# Altium schematic symbol library CUSTOM SCH - Copy.SchLib: 494 symbols (part 4 of 6) (continued)
## RTL8211F (continued)

## S2B-PH-SM4-TB(LF)(SN)
designator J?
Connector Header Surface Mount, Right Angle 2 position 0.079 _2.00mm_; Manufacturer Part Number: S2B-PH-SM4-TB_LF__SN_
footprint JST_S2B-PH-SM4-TB(LF)(SN)
footprint S2B-PH-SM4-TB(LF)(SN) (Header connector)
pins: 1, 2, S1 SHIELD, S2 SHIELD

## S25FL256SAGMFI000
designator U?
NOR Flash 256Mb 3V 133MHz Serial NOR Flash; Manufacturer Part Number: S25FL256SAGMFI000
part B pins: 1 HOLD#/IO3, 2 VCC, 3 RESET#/RFU, 4 DNU, 5 DNU, 6 RFU, 7 CS#, 8 SO/IO1, 9 WP#/IO2, 10 VSS, 11 DNU, 12 DNU, 13 NC, 14 VIO/RFU, 15 SI/IO0, 16 SCK

## SAMTEC-TSM-113-01-X-DV
designator J?  Manufacturer Part Number: TSM-113-01-S-DV
CONN HEADER SMD 26POS 2.54MM; Manufacturer: Samtec; Max Current Rating: 7A; Max Voltage Rating (AC): 475V; Number of Contacts: 26; Gender: Male; Connector Type: Male Pin; Row Spacing: 0.1inch
footprint *SAMTEC-TSM-113-01-X-DV
pins: 1, 2, 3, 4, 5, 6, 7, 8, 9, 10, 11, 12, 13, 14, 15, 16, 17, 18, 19, 20, 21, 22, 23, 24, 25, 26, 27, 28

## SAMTEC_QTE-020-01-F-D-A
designator J?
0.8mm Pitch 40 Position Connector Header, Outer Shroud Contacts Surface Mount Gold; Manufacturer Part Number: QTE-020-01-F-D-A; Case/Package: SMD
footprint SAMTEC_QTE-020-01-F-D-A
pins: 01, 02, 03, 04, 05, 06, 07, 08, 09, 10, 11, 12, 13, 14, 15, 16, 17, 18, 19, 20, 21, 22, 23, 24, 25, 26, 27, 28, 29, 30, 31, 32, 33, 34, 35, 36, 37, 38, 39, 40, G1 GND (power), G2 GND (power), G3 GND (power), G4 GND (power)

## SATA 3.0 Connector
designator J?
Manufacturer Part Number: *; Case/Package: *
footprint SATA30_7P_V_DIP
pins: 1 GND1, 2 TXP, 3 TXN, 4 GND2, 5 RXN, 6 RXP, 7 GND3, 8 GND4, 9 GND5

## SATA Connector
designator J?
Connector SATA BACKPLANE RECEPTACLE; Manufacturer Part Number: 1735284-2; Case/Package: SMD, Verticle
footprint SATA Connector (22 Pin SATA Connector)
pins: MP1, MP2, P1, P2, P3, P4, P5, P6, P7, P8, P9, P10, P11, P12, P13, P14, P15, S1, S2, S3, S4, S5, S6, S7

## SATA IDE Connector
designator J?
Manufacturer Part Number: *; Case/Package: TH
pins: 1 +5V, 2 GND1, 3 GND2, 4 +12V

## SATA_HYCW03-SATA22-420B
designator J?  Case/Package: SMD,P=1.27mm  Manufacturer Part Number: HYCW03-SATA22-420B
22 pin SATA, SMD,P=1.27mm Card Edge Connectors; Value: *
footprint HYCW03-SATA22-420B
pins: 1 GND, 2 TX+, 3 TX-, 4 GND, 5 RX-, 6 RX+, 7 GND, 8 3V3 DC, 9 3V3 DC, 10 3V3 DC, 11 GND, 12 GND, 13 GND, 14 5V DC, 15 5V DC, 16 5V DC, 17 GND, 18 GND, 19 GND, 20 12V DC, 21 12V DC, 22 12V DC, 23, 24

## SC530AI
designator U?
Image sensor 1/2.7"; Manufacturer Part Number: SC530AI; Case/Package: CSP 41-pin
footprint CSP41 (SC530AI)
1 alternate drawing of the same symbol

## SCHOTTKY
designator D?
Diode, Schottky, 40V, 5A, SMC; ComponentLink1Description: Datasheet link; ComponentLink1URL: http://www.comchip.com.tw/cms/UserFiles/QW-BB012%20CDBC520-G%7E5100-G%20RevC809622.pdf; Manufacturer Part Number: *; Case/Package: *
pins: A, K

## Schottky Dual Common Cathode_0
designator D?
pins: 1 A1, 2 A2, 3 K

## Screw Terminal
designator J?
5mm Pitch Fixed Terminal Blocks screw type; Manufacturer Part Number: TB001-500-02BE; Case/Package: 5mm Pitch TH
footprint Screw Terminal (5mm Pitch)
pins: 1, 2

## SCT2220TVBR
designator U?  Manufacturer Part Number: SCT2220TVBR
DC-DC Converters 2A, SOT563-6L; Case/Package: SOT563-6L
footprint SOT563
pins: 1 VIN, 2 SW, 3 GND, 4 BST, 5 EN, 6 FB

## SCT2230TVAR
designator U?, comment Manufacturer Part Number: SCT2230TVAR  (hidden comment: C918194)
DC-DC Converters 3A, SOT563-6L; Case/Package: SOT563-6L
footprint SOT563
pins: 1 VIN, 2 SW, 3 GND, 4 BST, 5 EN, 6 FB

## SCT2250FPAR
designator U16
DC-DC Converters 5A ,QFN-12 2x3mm; Case/Package: QFN-12; Manufacturer Part Number: SCT2250FPAR
footprint QFN-12_2x3mm
pins: 1 VIN, 2 PGND, 3 PG, 4 FSEL, 5 VOUT, 6 MODE, 7 SW, 8 BST, 9 VCC, 10 AGND, 11 FB, 12 EN

## SD6271LR-G1
designator U?  (value not drawn)
Step-Up Positive Adjustable 1 2A 1MHz SOT-23-6 DC-DC Converters RoHS; Value: 2A 1Mhz boost; Case/Package: SOT-23-6; Manufacturer Part Number: SD6271LR-G1
footprint SOT-23-6
pins: 1 LX, 2 GND, 3 FB, 4 EN, 5 VCC, 6 OC

## SD Card
designator J?, comment DM3AT-SF-PEJM5(40)
Micro,std mount SD Memory Card Micro,std mount SD Memory Card; Manufacturer Part Number: DM3AT-SF-PEJM5(40); Case/Package: SMD
footprint DM3AT-SF-PEJM5(40)
pins: 1 D2, 2 CS/D3, 3 CMD, 4 VDD_3V3, 5 CLK, 6 GND, 7 D0, 8 D1, 9 CD
text: μSD CARD SOCKET

## SD Card Socket
designator J?
Memory Card Connectors TFR PUSH PUSH TYPE V YPE VSS DEECT SWITCH; Manufacturer Part Number: TF-018B-H15; Case/Package: SMD
footprint 473521001
footprint mix SD card socket
pins: 1 DATA2, 2 CD/DATA3, 3 CMD, 4 VDD, 5 CLK, 6 VSS, 7 DATA0, 8 DATA1, 9 SW, 10 SHIELD

## SDA04H1SBD
designator S?
SWITCH SLIDE DIP SPST 25MA 24V; Manufacturer: ITT C&K; Manufacturer Part Number: SDA04H1SBD; Body Material: Polyphenylene; Mechanical Life: 1000Cycles; Actuator Material: Polyamide; Number of Positions: 4; Max Current Rating: 100mA; Contact Resistance: 50mR; Actuator Type: Slide (Standard); Pitch: 0.1inch; Actuator Length: 1mm; Washable: Yes; Supplier 1: Digi-Key; Stock 1: 11767; Pricing 1: 1=1.66, 10=1.563, 35=1.4994, 70=1.4036, 105=1.3717, 280=1.2122, 525=1.1484, 1015=1.0208, 5005=0.8932 (USD); Mount: Surface Mount; Case/Package: DIP; Contact Material: Copper; Contact Plating: Gold; Min Operating Temperature: -40°C; Max Operating Temperature: 85°C; Throw Configuration: SPST; Packaging: Rail/Tube; Current Rating: 25mA; Package Quantity: 35; Voltage Rating (DC): 24V; Max Voltage Rating (DC): 24V; Termination: Gull Wing; Electrical Life: 1000Cycles; Number of Circuits: 4; Orientation: Straight; Length: 0.476inch; Terminal Pitch: 2.54mm; Depth: 9.3mm; Radiation Hardening: No; REACH SVHC: No SVHC; Lead Free: Lead Free; ComponentLink1URL: https://www.ckswitches.com/media/1327/sda.pdf?src-supplier=Digi-Key; ComponentLink1Description: https://www.ckswitches.com/media/1327/sda.pdf?src-supplier=Digi-Key; ComponentLink2URL: http://www.farnell.com/datasheets/1839864.pdf?src-supplier=Element14; ComponentLink2Description: http://www.farnell.com/datasheets/1839864.pdf?src-supplier=Element14; Supplier Part Number 1: CKN6068-ND
footprint sda04h1sbd
pins: 1, 2, 3, 4, 5, 6, 7, 8

## SED8840
designator U?
Manufacturer Part Number: SED8840; Case/Package: DFN(5x2)
footprint SED8840
pins: 1 S1, 2 S1, 3 G1, 4 S2, 5 S2, 6 G2

## SGM2576
designator U?  Manufacturer Part Number: SGM2576  Case/Package: SOT-23-5
1A Current Limited Load Switch
footprint SOT_23_5
footprint SOT23-5
pins: 1 VOUT, 2 GND, 3 OCB, 4 EN, 5 IN

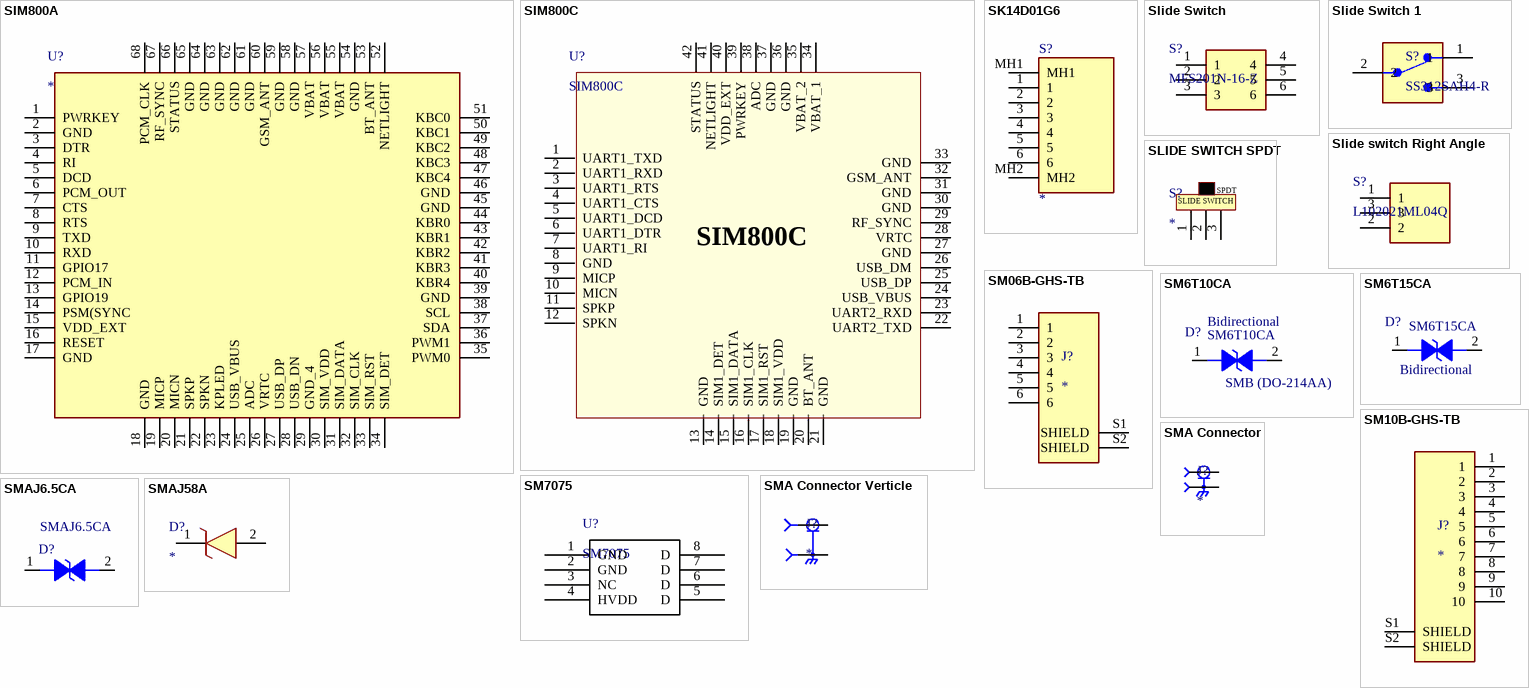
[diagram p38: symbols SIM800A to SMAJ58A]

## SIM800A
designator U?
Integrated Circuit; Manufacturer_Name: SIMCOM; Manufacturer Part Number: SIM800A; Datasheet Link: http://simcom.ee/documents/SIM800/SIM800_Hardware%20Design_V1.08.pdf
footprint sim808
pins: 1 PWRKEY, 2 GND, 3 DTR, 4 RI, 5 DCD, 6 PCM_OUT, 7 CTS, 8 RTS, 9 TXD, 10 RXD, 11 GPIO17, 12 PCM_IN, 13 GPIO19, 14 PSM(SYNC, 15 VDD_EXT, 16 RESET, 17 GND, 18 GND, 19 MICP, 20 MICN, 21 SPKP, 22 SPKN, 23 KPLED, 24 USB_VBUS, 25 ADC, 26 VRTC, 27 USB_DP, 28 USB_DN, 29 GND_4, 30 SIM_VDD, 31 SIM_DATA, 32 SIM_CLK, 33 SIM_RST, 34 SIM_DET, 35 PWM0, 36 PWM1, 37 SDA, 38 SCL, 39 GND, 40 KBR4, 41 KBR3, 42 KBR2, 43 KBR1, 44 KBR0, 45 GND, 46 GND, 47 KBC4, 48 KBC3, 49 KBC2, 50 KBC1, 51 KBC0, 52 NETLIGHT, 53 BT_ANT, 54 GND, 55 VBAT, 56 VBAT, 57 VBAT, 58 GND, 59 GND, 60 GSM_ANT, 61 GND, 62 GND, 63 GND, 64 GND, 65 GND, 66 STATUS, 67 RF_SYNC, 68 PCM_CLK

## SIM800C
designator U?
Integrated Circuit; Manufacturer Name: SIMCOM; Datasheet Link: http://www.sabreadv.com/wp-content/uploads/SIM800C_Hardware_Design_V1.00.pdf; Manufacturer Part Number: SIM800C
footprint SIM800C
pins: 1 UART1_TXD, 2 UART1_RXD, 3 UART1_RTS, 4 UART1_CTS, 5 UART1_DCD, 6 UART1_DTR, 7 UART1_RI, 8 GND, 9 MICP, 10 MICN, 11 SPKP, 12 SPKN, 13 GND, 14 SIM1_DET, 15 SIM1_DATA, 16 SIM1_CLK, 17 SIM1_RST, 18 SIM1_VDD, 19 GND, 20 BT_ANT, 21 GND, 22 UART2_TXD, 23 UART2_RXD, 24 USB_VBUS, 25 USB_DP, 26 USB_DM, 27 GND, 28 VRTC, 29 RF_SYNC, 30 GND, 31 GND, 32 GSM_ANT, 33 GND, 34 VBAT_1, 35 VBAT_2, 36 GND, 37 GND, 38 ADC, 39 PWRKEY, 40 VDD_EXT, 41 NETLIGHT, 42 STATUS

## SK14D01G6
designator S?
1 pole 4 way slider switch (4 channel switch); Manufacturer_Name: C & K COMPONENTS; Manufacturer Part Number: SK14D01G6; Datasheet Link: https://www.arrow.com/en/products/sk14d01g6/ck; Height: 4.7mm; Mouser Part Number: 611-SK-14D01-G6
footprint SK14D01G6
pins: 1, 2, 3, 4, 5, 6, MH1, MH2

## Slide Switch
designator S?, comment MFS201N-16-Z
Sub-miniature Switch; Manufacturer Part Number: MFS201N-16-Z; Case/Package: TH
footprint MFS201N-16-Z
pins: 1, 2, 3, 4, 5, 6

## Slide Switch 1
designator S?, comment SS312SAH4-R
Case/Package: SMD/SMT; Manufacturer Part Number: SS312SAH4-R
footprint SW_SS312SAH4-R
footprint SW_SS312SAH4-R
pins: 1, 2, 3

## Slide switch Right Angle
designator S?, comment L102021ML04Q
Switch; Case/Package: TH; Manufacturer_Part_Number: L102021ML04Q
footprint L101011ML04Q
footprint L102021ML04Q
pins: 1, 2, 3

## SLIDE SWITCH SPDT
designator S?
SLIDE SWITCH SPDT 2.54MM
pins: 1, 2, 3
text: SPDT; SLIDE SWITCH

## SM06B-GHS-TB
designator J?
Connector Header Surface Mount, Right Angle 6 position 0.049 _1.25mm_; Manufacturer Part Number: SM06B-GHS-TB_LF__SN_; Case/Package: SMD; Link: https://www.aliexpress.com/item/33004999781.html?spm=a2g0o.productlist.0.0.721b2962JEtU0i&algo_pvid=f5117c2c-479e-4e43-8eb5-8fb5a61b8fdb&algo_exp_id=f5117c2c-479e-4e43-8eb5-8fb5a61b8fdb-7&pdp_ext_f=%7B%22sku_id%22%3A%2266974327093%22%7D
footprint SM06B-GHS-TB
pins: 1, 2, 3, 4, 5, 6, S1 SHIELD, S2 SHIELD

## SM6T10CA
designator D?  Direction: Bidirectional  Manufacturer Part Number: SM6T10CA  Case/Package: SMB (DO-214AA)  (hidden comment: *)
Manufacturer: STMicroelectronics; Clamping Voltage: 18.6V; Peak Pulse Power: 600W; Reverse Standoff Voltage: 8.55V; Peak Pulse Current: 215A; Min Breakdown Voltage: 9.5V; Breakdown Voltage: 10.5V; Max Surge Current: 41A; Number of Bidirectional Channels: 1; Power Line Protection: No; Test Current: 1mA; Max Reverse Leakage Current: 20uA; Element Configuration: Single; Capacitance: 2.8nF; Voltage Rating (DC): 10V; ComponentLink1URL: https://www.verical.com/server-webapp/html/getDatasheet?partID=98609&src-supplier=Verical; ComponentLink1Description: https://www.verical.com/server-webapp/html/getDatasheet?partID=98609&src-supplier=Verical; ComponentLink2URL: http://www.farnell.com/datasheets/1761324.pdf?src-supplier=Element14; ComponentLink2Description: http://www.farnell.com/datasheets/1761324.pdf?src-supplier=Element14; ComponentLink3URL: http://www.jameco.com/Jameco/Products/ProdDS/1394494.pdf?src-supplier=Jameco; ComponentLink3Description: http://www.jameco.com/Jameco/Products/ProdDS/1394494.pdf?src-supplier=Jameco; ComponentLink4URL: http://www.st.com/content/ccc/resource/technical/document/datasheet/6f/2d/a6/9e/56/51/48/15/CD00000725.pdf/files/CD00000725.pdf/jcr:content/translations/en.CD00000725.pdf?src-supplier=Digi-Key; ComponentLink4Description: http://www.st.com/content/ccc/resource/technical/document/datasheet/6f/2d/a6/9e/56/51/48/15/CD00000725.pdf/files/CD00000725.pdf/jcr:content/translations/en.CD00000725.pdf?src-supplier=Digi-Key; ComponentLink5URL: http://www.st.com/st-web-ui/static/active/en/resource/technical/document/datasheet/CD00000725.pdf?src-supplier=Avnet; ComponentLink5Description: http://www.st.com/st-web-ui/static/active/en/resource/technical/document/datasheet/CD00000725.pdf?src-supplier=Avnet; ComponentLink6URL: http://www.st.com/st-web-ui/static/active/en/resource/technical/document/datasheet/CD00000725.pdf?src-supplier=Future+Electronics; ComponentLink6Description: http://www.st.com/st-web-ui/static/active/en/resource/technical/document/datasheet/CD00000725.pdf?src-supplier=Future+Electronics; ComponentLink7URL: https://www.distrelec.biz/Web/Downloads/ta/_e/xbSM6T_data_e.pdf?mime=application%2Fpdf&src-supplier=Distrelec; ComponentLink7Description: https://www.distrelec.biz/Web/Downloads/ta/_e/xbSM6T_data_e.pdf?mime=application%2Fpdf&src-supplier=Distrelec; Supplier 1: Digi-Key; Stock 1: 2460; Pricing 1: 1=0.48, 10=0.408, 100=0.3046, 500=0.2393, 1000=0.1849 (USD); Mount: Surface Mount; Number of Pins: 2; Min Operating Temperature: -55°C; Max Operating Temperature: 150°C; Packaging: Tape and Reel; Package Quantity: 1; Polarity: Bidirectional; Operating Supply Voltage: 8.55V; Composition: Zener; Reverse Breakdown Voltage: 9.5V; Number of Elements: 1; Number of Channels: 1; Leakage Current: 20uA; Termination: SMD/SMT; Max Breakdown Voltage: 10.5V; Power Dissipation: 600W; Length: 4.6mm; Height: 2.45mm; Width: 3.95mm; Radiation Hardening: No; Lead Free: Lead Free; REACH SVHC: No SVHC; ComponentLink8URL: https://www.verical.com/server-webapp/html/getDatasheet?partID=160132&src-supplier=Verical; ComponentLink8Description: https://www.verical.com/server-webapp/html/getDatasheet?partID=160132&src-supplier=Verical; ComponentLink9URL: http://datasheet.iiic.cc/stmicroelectronics/SM6T10CA.pdf?src-supplier=IIIC; ComponentLink9Description: http://datasheet.iiic.cc/stmicroelectronics/SM6T10CA.pdf?src-supplier=IIIC; Supplier Part Number 1: 497-7427-6-ND
footprint smb
pins: 1, 2

## SM6T15CA
designator D?  Direction: Bidirectional  Manufacturer Part Number: SM6T15CA  (hidden comment: *)
Manufacturer: STMicroelectronics; Reverse Standoff Voltage: 12.8V; Clamping Voltage: 27.2V; Peak Pulse Power: 600W; Peak Pulse Current: 147A; Min Breakdown Voltage: 14.3V; Breakdown Voltage: 15V; Test Current: 1mA; Number of Elements: 1; Power Line Protection: No; Max Reverse Leakage Current: 200nA; Element Configuration: Single; Max Breakdown Voltage: 15.8V; Capacitance: 1.9nF; Supplier 1: Digi-Key; Stock 1: 7500; Pricing 1: 2500=0.1637, 5000=0.1531, 12500=0.1426, 25000=0.1352, 62500=0.132 (USD); Mount: Surface Mount; Case/Package: SMB (DO-214AA); Number of Pins: 2; Min Operating Temperature: -55°C; Max Operating Temperature: 150°C; Packaging: Tape and Reel; Package Quantity: 1; Polarity: Bidirectional; Max Surge Current: 1mA; Operating Supply Voltage: 12.8V; Reverse Breakdown Voltage: 14.3V; Number of Bidirectional Channels: 1; Leakage Current: 200nA; Composition: Zener; Termination: SMD/SMT; Power Dissipation: 600W; ESD Protection: No; Voltage Rating (DC): 15V; Length: 4.6mm; Height: 2.45mm; Width: 3.95mm; Radiation Hardening: No; REACH SVHC: No SVHC; Lead Free: Lead Free; ComponentLink1URL: https://www.verical.com/server-webapp/html/getDatasheet?partID=98609&src-supplier=Verical; ComponentLink1Description: https://www.verical.com/server-webapp/html/getDatasheet?partID=98609&src-supplier=Verical; ComponentLink2URL: http://www.farnell.com/datasheets/1761324.pdf?src-supplier=Element14; ComponentLink2Description: http://www.farnell.com/datasheets/1761324.pdf?src-supplier=Element14; ComponentLink3URL: http://www.jameco.com/Jameco/Products/ProdDS/1394494.pdf?src-supplier=Jameco; ComponentLink3Description: http://www.jameco.com/Jameco/Products/ProdDS/1394494.pdf?src-supplier=Jameco; ComponentLink4URL: http://www.st.com/content/ccc/resource/technical/document/datasheet/6f/2d/a6/9e/56/51/48/15/CD00000725.pdf/files/CD00000725.pdf/jcr:content/translations/en.CD00000725.pdf?src-supplier=Digi-Key; ComponentLink4Description: http://www.st.com/content/ccc/resource/technical/document/datasheet/6f/2d/a6/9e/56/51/48/15/CD00000725.pdf/files/CD00000725.pdf/jcr:content/translations/en.CD00000725.pdf?src-supplier=Digi-Key; ComponentLink5URL: http://www.st.com/st-web-ui/static/active/en/resource/technical/document/datasheet/CD00000725.pdf?src-supplier=Avnet; ComponentLink5Description: http://www.st.com/st-web-ui/static/active/en/resource/technical/document/datasheet/CD00000725.pdf?src-supplier=Avnet; ComponentLink6URL: http://www.st.com/st-web-ui/static/active/en/resource/technical/document/datasheet/CD00000725.pdf?src-supplier=Future+Electronics; ComponentLink6Description: http://www.st.com/st-web-ui/static/active/en/resource/technical/document/datasheet/CD00000725.pdf?src-supplier=Future+Electronics; ComponentLink7URL: https://www.distrelec.biz/Web/Downloads/ta/_e/xbSM6T_data_e.pdf?mime=application%2Fpdf&src-supplier=Distrelec; ComponentLink7Description: https://www.distrelec.biz/Web/Downloads/ta/_e/xbSM6T_data_e.pdf?mime=application%2Fpdf&src-supplier=Distrelec; Supplier Part Number 1: 497-2994-2-ND
footprint smb
pins: 1, 2

## SM10B-GHS-TB
designator J?
Connector Header Surface Mount, Right Angle 10 position 0.049 _1.25mm_; Manufacturer Part Number: SM10B-GHS-TB_LF__SN_; Case/Package: SMD; Link: https://www.aliexpress.com/item/33049613876.html?spm=a2g0o.productlist.0.0.7c2e4ff4nnengi&algo_pvid=30c285fb-e6ca-49ff-8df9-74fe066a1bab&algo_exp_id=30c285fb-e6ca-49ff-8df9-74fe066a1bab-0&pdp_ext_f=%7B%22sku_id%22%3A%2267442917704%22%7D
footprint SM10B-GHS-TB(LF)(SN)
pins: 1, 2, 3, 4, 5, 6, 7, 8, 9, 10, S1 SHIELD, S2 SHIELD

## SM7075
designator U?
Mfr. No: SM7075-12; Value: 12V/300mA; Package: DIP8
pins: 1 GND, 2 GND, 3 NC, 4 HVDD, 5 D, 6 D, 7 D, 8 D

## SMA Connector
designator J?
SMA Connector Jack, Female Socket 50Ohm Through Hole, Right Angle Solder; Manufacturer Part Number: SMA-J-P-H-RA-TH1; Case/Package: TH
footprint SMA Connector (SAMTEC_SMA-J-P-X-RA-TH1)
pins: 1, 2, 3 2, 4 2, 5 2

## SMA Connector Verticle
designator J?
Verticle SMA Connector Receptacle, Female Socket 50Ohm Through Hole Solder; Manufacturer Part Number: 73391-0060; Case/Package: None
footprint SMA Connector verticle (MOLEX 73391-0060)
pins: 1, 2, 3 2, 4 2, 5 2

## SMAJ6.5CA
designator D?  Manufacturer Part Number: SMAJ6.5CA
ESD Suppressors / TVS Diodes 400W 6.5V 5% Bi-Directional; Manufacturer: Littelfuse; Min Breakdown Voltage: 7.22V; Clamping Voltage: 11.2V; Polarity: Bidirectional; Peak Pulse Current: 35.7A; Test Current: 10mA; Number of Elements: 1; Leakage Current: 1mA; Power Line Protection: No; Max Breakdown Voltage: 7.98V; Max Power Dissipation: 3.3W; Supplier 1: Mouser; Stock 1: 13830; Pricing 1: 1=0.4, 10=0.342, 50=0.342, 100=0.24, 500=0.199, 1000=0.137, 5000=0.125, 10000=0.125, 25000=0.108 (USD); Mount: Surface Mount; Number of Pins: 2; Min Operating Temperature: -55°C; Max Operating Temperature: 150°C; Packaging: Tape and Reel; Reverse Standoff Voltage: 6.5V; Peak Pulse Power: 400W; Breakdown Voltage: 7.22V; Package Quantity: 5000; Max Surge Current: 35.7A; Reverse Breakdown Voltage: 7.22V; Termination: SMD/SMT; Direction: Bidirectional; Operating Supply Voltage: 6.5V; Number of Bidirectional Channels: 1; Number of Channels: 1; Voltage Rating (DC): 6.5V; Case/Package: DO-214AC-2; Power Dissipation: 400W; Length: 5.28mm; Height: 2.29mm; Width: 2.79mm; Lead Free: Lead Free; REACH SVHC: No SVHC; ComponentLink1URL: http://www.littelfuse.com/~/media/electronics/datasheets/tvs_diodes/littelfuse_tvs_diode_smaj_datasheet.pdf.pdf?src-supplier=Digi-Key; ComponentLink1Description: http://www.littelfuse.com/~/media/electronics/datasheets/tvs_diodes/littelfuse_tvs_diode_smaj_datasheet.pdf.pdf?src-supplier=Digi-Key; ComponentLink2URL: http://www.littelfuse.com/data/en/Data_Sheets/Littelfuse_TVS-Diode_SMAJ.pdf?src-supplier=Future+Electronics; ComponentLink2Description: http://www.littelfuse.com/data/en/Data_Sheets/Littelfuse_TVS-Diode_SMAJ.pdf?src-supplier=Future+Electronics; Supplier Part Number 1: 576-SMAJ6.5CA
footprint DO-214AC(SMA)
pins: 1, 2

## SMAJ58A
designator D?
Littelfuse SMAJ58A Uni-Directional TVS Diode; Manufacturer Part Number: SMAJ58A; Case/Package: DO-214AC
footprint DIOM5026X229N
pins: 1 K, 2 A

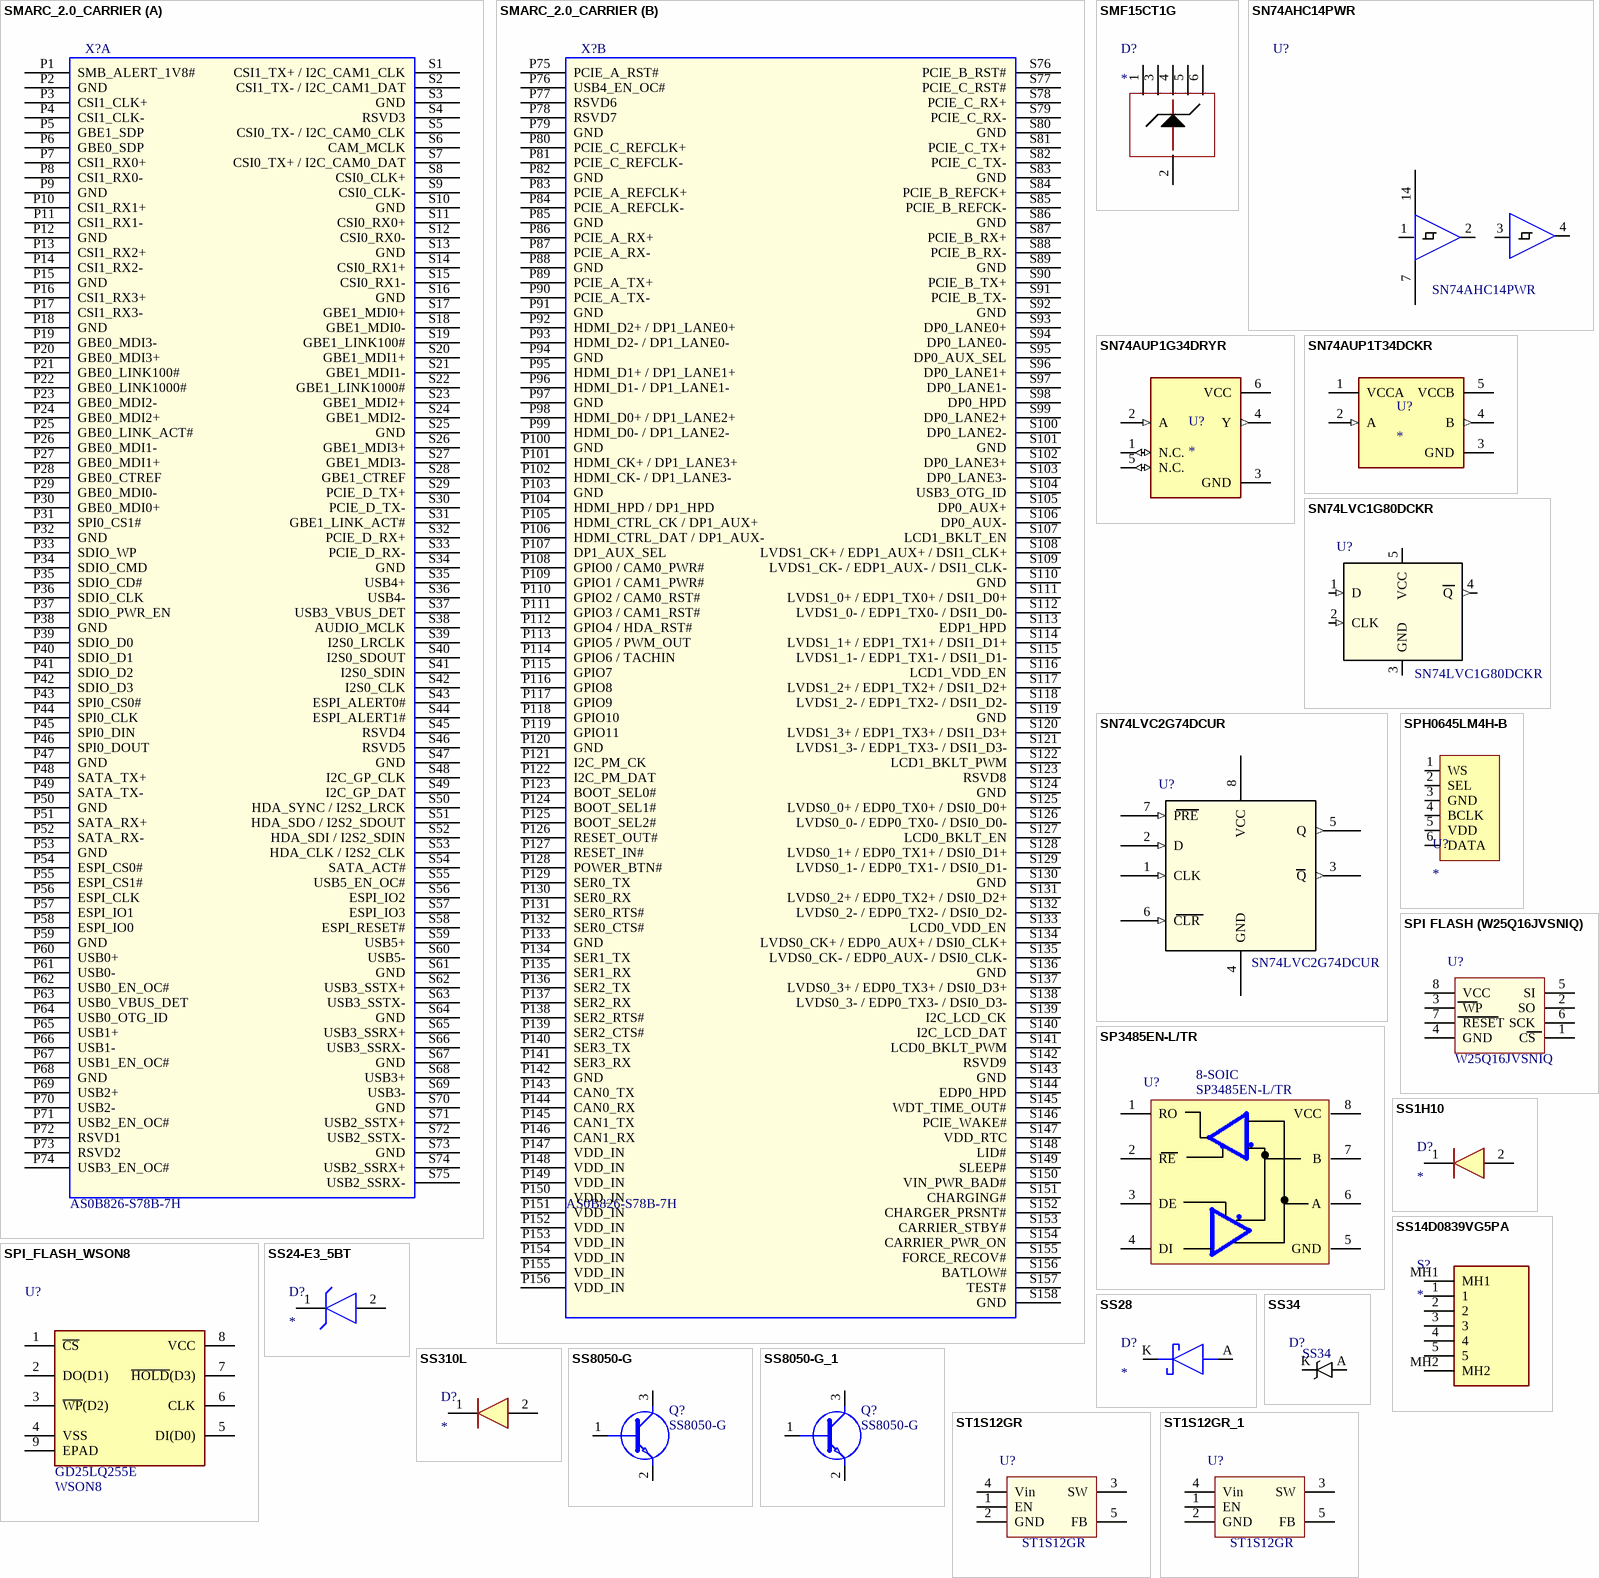
[diagram p39: symbols SMARC_2.0_CARRIER to ST1S12GR_1]

## SMARC_2.0_CARRIER
designator X?, comment AS0B826-S78B-7H
Card Edge Connectors; Case/Package: *; Manufacturer Part Number: AS0B826-S78B-7H
footprint AS0B821-S78B-7H
part A pins: P1 SMB_ALERT_1V8#, P2 GND (power), P3 CSI1_CLK+, P4 CSI1_CLK-, P5 GBE1_SDP, P6 GBE0_SDP, P7 CSI1_RX0+, P8 CSI1_RX0-, P9 GND (power), P10 CSI1_RX1+, P11 CSI1_RX1-, P12 GND (power), P13 CSI1_RX2+, P14 CSI1_RX2-, P15 GND (power), P16 CSI1_RX3+, P17 CSI1_RX3-, P18 GND (power), P19 GBE0_MDI3-, P20 GBE0_MDI3+, P21 GBE0_LINK100#, P22 GBE0_LINK1000#, P23 GBE0_MDI2-, P24 GBE0_MDI2+, P25 GBE0_LINK_ACT#, P26 GBE0_MDI1-, P27 GBE0_MDI1+, P28 GBE0_CTREF, P29 GBE0_MDI0-, P30 GBE0_MDI0+, P31 SPI0_CS1#, P32 GND (power), P33 SDIO_WP, P34 SDIO_CMD, P35 SDIO_CD#, P36 SDIO_CLK, P37 SDIO_PWR_EN, P38 GND (power), P39 SDIO_D0, P40 SDIO_D1, P41 SDIO_D2, P42 SDIO_D3, P43 SPI0_CS0#, P44 SPI0_CLK, P45 SPI0_DIN, P46 SPI0_DOUT, P47 GND (power), P48 SATA_TX+, P49 SATA_TX-, P50 GND (power), P51 SATA_RX+, P52 SATA_RX-, P53 GND (power), P54 ESPI_CS0#, P55 ESPI_CS1#, P56 ESPI_CLK, P57 ESPI_IO1, P58 ESPI_IO0, P59 GND (power), P60 USB0+, P61 USB0-, P62 USB0_EN_OC#, P63 USB0_VBUS_DET, P64 USB0_OTG_ID, P65 USB1+, P66 USB1-, P67 USB1_EN_OC#, P68 GND (power), P69 USB2+, P70 USB2-, P71 USB2_EN_OC#, P72 RSVD1, P73 RSVD2, P74 USB3_EN_OC#, S1 CSI1_TX+ / I2C_CAM1_CLK, S2 CSI1_TX- / I2C_CAM1_DAT, S3 GND (power), S4 RSVD3, S5 CSI0_TX- / I2C_CAM0_CLK, S6 CAM_MCLK, S7 CSI0_TX+ / I2C_CAM0_DAT, S8 CSI0_CLK+, S9 CSI0_CLK-, S10 GND (power), S11 CSI0_RX0+, S12 CSI0_RX0-, S13 GND (power), S14 CSI0_RX1+, S15 CSI0_RX1-, S16 GND (power), S17 GBE1_MDI0+, S18 GBE1_MDI0-, S19 GBE1_LINK100#, S20 GBE1_MDI1+, S21 GBE1_MDI1-, S22 GBE1_LINK1000#, S23 GBE1_MDI2+, S24 GBE1_MDI2-, S25 GND (power), S26 GBE1_MDI3+, S27 GBE1_MDI3-, S28 GBE1_CTREF, S29 PCIE_D_TX+, S30 PCIE_D_TX-, S31 GBE1_LINK_ACT#, S32 PCIE_D_RX+, S33 PCIE_D_RX-, S34 GND (power), S35 USB4+, S36 USB4-, S37 USB3_VBUS_DET, S38 AUDIO_MCLK, S39 I2S0_LRCLK, S40 I2S0_SDOUT, S41 I2S0_SDIN, S42 I2S0_CLK, S43 ESPI_ALERT0#, S44 ESPI_ALERT1#, S45 RSVD4, S46 RSVD5, S47 GND (power), S48 I2C_GP_CLK, S49 I2C_GP_DAT, S50 HDA_SYNC / I2S2_LRCK, S51 HDA_SDO / I2S2_SDOUT, S52 HDA_SDI / I2S2_SDIN, S53 HDA_CLK / I2S2_CLK, S54 SATA_ACT#, S55 USB5_EN_OC#, S56 ESPI_IO2, S57 ESPI_IO3, S58 ESPI_RESET#, S59 USB5+, S60 USB5-, S61 GND (power), S62 USB3_SSTX+, S63 USB3_SSTX-, S64 GND (power), S65 USB3_SSRX+, S66 USB3_SSRX-, S67 GND (power), S68 USB3+, S69 USB3-, S70 GND (power), S71 USB2_SSTX+, S72 USB2_SSTX-, S73 GND (power), S74 USB2_SSRX+, S75 USB2_SSRX-
part B pins: P75 PCIE_A_RST#, P76 USB4_EN_OC#, P77 RSVD6, P78 RSVD7, P79 GND (power), P80 PCIE_C_REFCLK+, P81 PCIE_C_REFCLK-, P82 GND (power), P83 PCIE_A_REFCLK+, P84 PCIE_A_REFCLK-, P85 GND (power), P86 PCIE_A_RX+, P87 PCIE_A_RX-, P88 GND (power), P89 PCIE_A_TX+, P90 PCIE_A_TX-, P91 GND (power), P92 HDMI_D2+ / DP1_LANE0+, P93 HDMI_D2- / DP1_LANE0-, P94 GND (power), P95 HDMI_D1+ / DP1_LANE1+, P96 HDMI_D1- / DP1_LANE1-, P97 GND (power), P98 HDMI_D0+ / DP1_LANE2+, P99 HDMI_D0- / DP1_LANE2-, P100 GND (power), P101 HDMI_CK+ / DP1_LANE3+, P102 HDMI_CK- / DP1_LANE3-, P103 GND (power), P104 HDMI_HPD / DP1_HPD, P105 HDMI_CTRL_CK / DP1_AUX+, P106 HDMI_CTRL_DAT / DP1_AUX-, P107 DP1_AUX_SEL, P108 GPIO0 / CAM0_PWR#, P109 GPIO1 / CAM1_PWR#, P110 GPIO2 / CAM0_RST#, P111 GPIO3 / CAM1_RST#, P112 GPIO4 / HDA_RST#, P113 GPIO5 / PWM_OUT, P114 GPIO6 / TACHIN, P115 GPIO7, P116 GPIO8, P117 GPIO9, P118 GPIO10, P119 GPIO11, P120 GND (power), P121 I2C_PM_CK, P122 I2C_PM_DAT, P123 BOOT_SEL0#, P124 BOOT_SEL1#, P125 BOOT_SEL2#, P126 RESET_OUT#, P127 RESET_IN#, P128 POWER_BTN#, P129 SER0_TX, P130 SER0_RX, P131 SER0_RTS#, P132 SER0_CTS#, P133 GND (power), P134 SER1_TX, P135 SER1_RX, P136 SER2_TX, P137 SER2_RX, P138 SER2_RTS#, P139 SER2_CTS#, P140 SER3_TX, P141 SER3_RX, P142 GND (power), P143 CAN0_TX, P144 CAN0_RX, P145 CAN1_TX, P146 CAN1_RX, P147 VDD_IN (power), P148 VDD_IN (power), P149 VDD_IN (power), P150 VDD_IN (power), P151 VDD_IN (power), P152 VDD_IN (power), P153 VDD_IN (power), P154 VDD_IN (power), P155 VDD_IN (power), P156 VDD_IN (power), S76 PCIE_B_RST#, S77 PCIE_C_RST#, S78 PCIE_C_RX+, S79 PCIE_C_RX-, S80 GND (power), S81 PCIE_C_TX+, S82 PCIE_C_TX-, S83 GND (power), S84 PCIE_B_REFCK+, S85 PCIE_B_REFCK-, S86 GND (power), S87 PCIE_B_RX+, S88 PCIE_B_RX-, S89 GND (power), S90 PCIE_B_TX+, S91 PCIE_B_TX-, S92 GND (power), S93 DP0_LANE0+, S94 DP0_LANE0-, S95 DP0_AUX_SEL, S96 DP0_LANE1+, S97 DP0_LANE1-, S98 DP0_HPD, S99 DP0_LANE2+, S100 DP0_LANE2-, S101 GND (power), S102 DP0_LANE3+, S103 DP0_LANE3-, S104 USB3_OTG_ID, S105 DP0_AUX+, S106 DP0_AUX-, S107 LCD1_BKLT_EN, S108 LVDS1_CK+ / EDP1_AUX+ / DSI1_CLK+, S109 LVDS1_CK- / EDP1_AUX- / DSI1_CLK-, S110 GND (power), S111 LVDS1_0+ / EDP1_TX0+ / DSI1_D0+, S112 LVDS1_0- / EDP1_TX0- / DSI1_D0-, S113 EDP1_HPD, S114 LVDS1_1+ / EDP1_TX1+ / DSI1_D1+, S115 LVDS1_1- / EDP1_TX1- / DSI1_D1-, S116 LCD1_VDD_EN, S117 LVDS1_2+ / EDP1_TX2+ / DSI1_D2+, S118 LVDS1_2- / EDP1_TX2- / DSI1_D2-, S119 GND (power), S120 LVDS1_3+ / EDP1_TX3+ / DSI1_D3+, S121 LVDS1_3- / EDP1_TX3- / DSI1_D3-, S122 LCD1_BKLT_PWM, S123 RSVD8, S124 GND (power), S125 LVDS0_0+ / EDP0_TX0+ / DSI0_D0+, S126 LVDS0_0- / EDP0_TX0- / DSI0_D0-, S127 LCD0_BKLT_EN, S128 LVDS0_1+ / EDP0_TX1+ / DSI0_D1+, S129 LVDS0_1- / EDP0_TX1- / DSI0_D1-, S130 GND (power), S131 LVDS0_2+ / EDP0_TX2+ / DSI0_D2+, S132 LVDS0_2- / EDP0_TX2- / DSI0_D2-, S133 LCD0_VDD_EN, S134 LVDS0_CK+ / EDP0_AUX+ / DSI0_CLK+, S135 LVDS0_CK- / EDP0_AUX- / DSI0_CLK-, S136 GND (power), S137 LVDS0_3+ / EDP0_TX3+ / DSI0_D3+, S138 LVDS0_3- / EDP0_TX3- / DSI0_D3-, S139 I2C_LCD_CK, S140 I2C_LCD_DAT, S141 LCD0_BKLT_PWM, S142 RSVD9, S143 GND (power), S144 EDP0_HPD, S145 WDT_TIME_OUT#, S146 PCIE_WAKE#, S147 VDD_RTC, S148 LID#, S149 SLEEP#, S150 VIN_PWR_BAD#, S151 CHARGING#, S152 CHARGER_PRSNT#, S153 CARRIER_STBY#, S154 CARRIER_PWR_ON, S155 FORCE_RECOV#, S156 BATLOW#, S157 TEST#, S158 GND (power)